# Altium footprint library lib_protel_HC.PCBLIB: 724 footprints (part 30 of 46)
Each footprint in its own frame and in the unit in brackets; x right, y up, seen from the top. Pads: shape width x height; smd on the part's side, far side on the other; paste and mask are expansions set on the pad; w line width, h text height; cw(c..) or ccw(c..) is an arc to the next point about the centre after c.
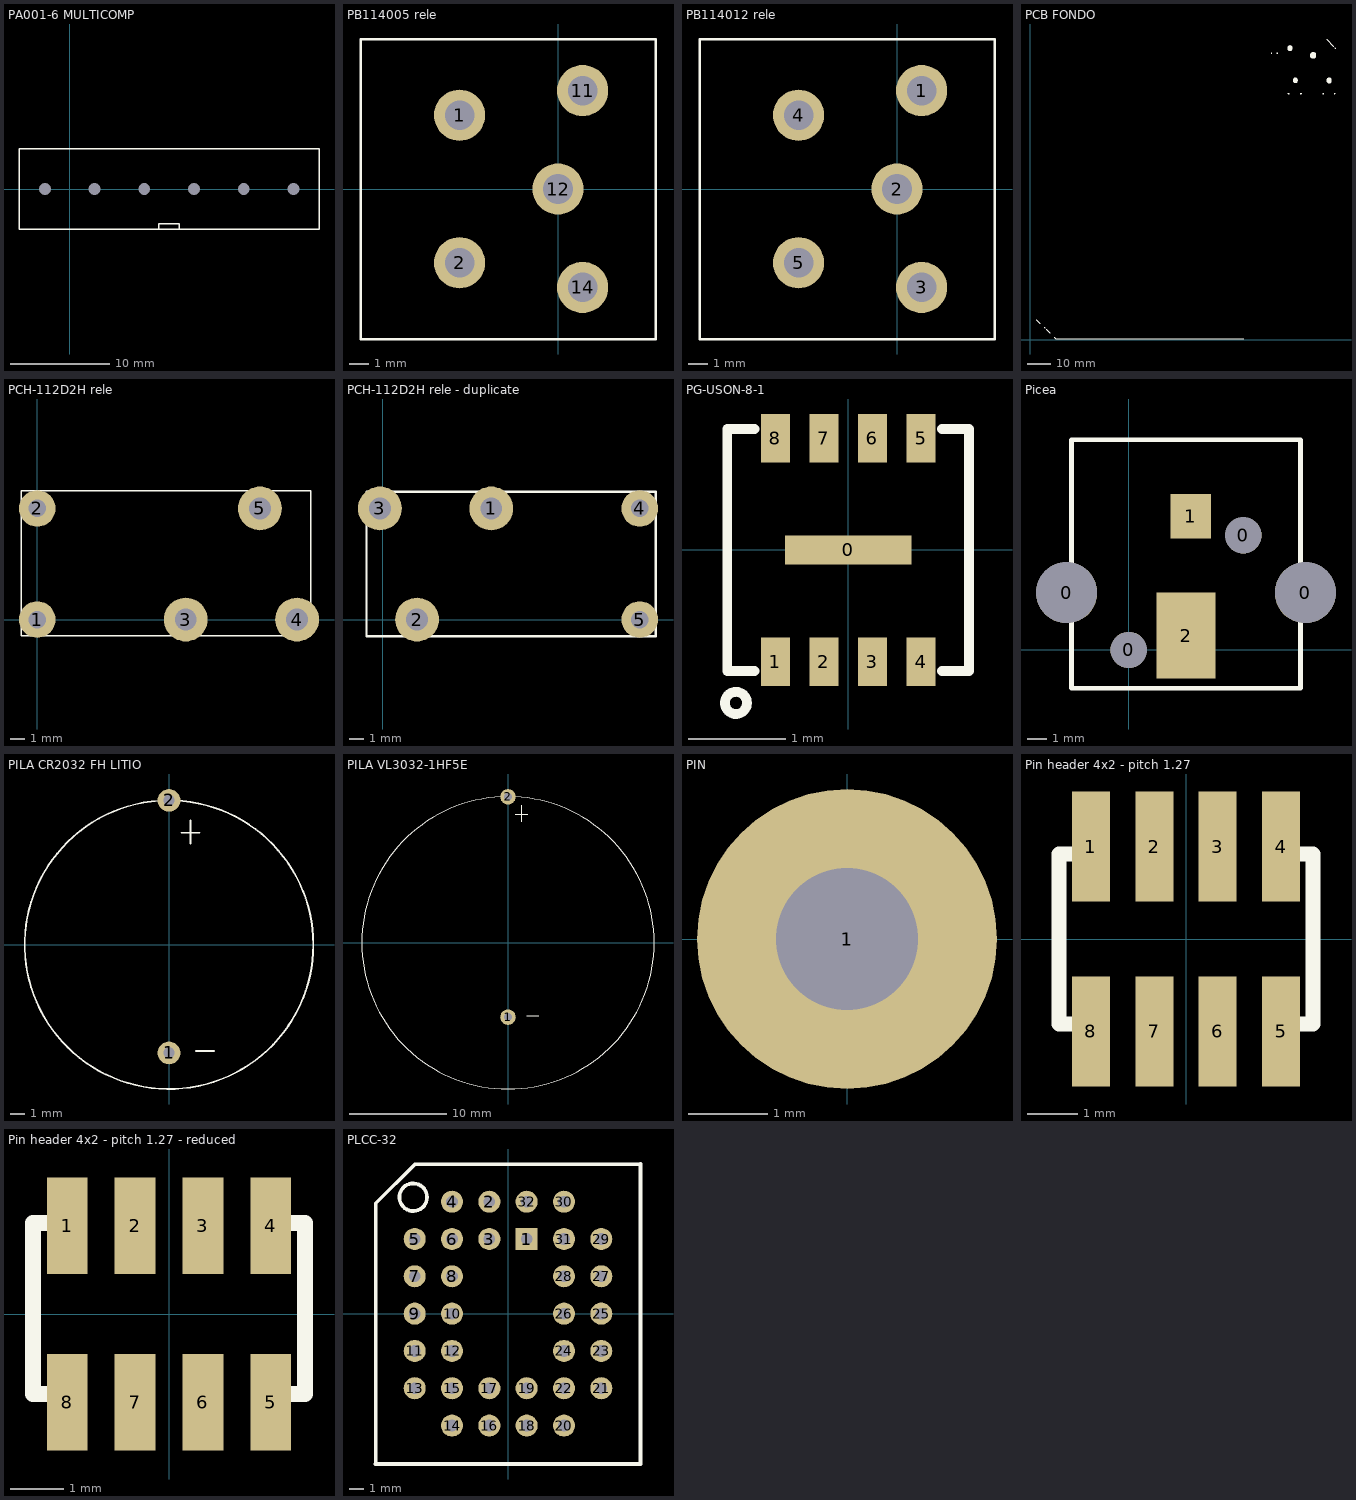
[diagram p29: the footprints below, top view; thin cyan lines are the x and y axes]

## PA001-6 MULTICOMP [mm] "paso 5mm altura 11mm"
height 11
pads (6):
  round 0 / inner round 0 / far side round 2.6 hole 1.2: 1(-2.5,0) 2(2.5,0) 3(7.5,0) 4(12.5,0) 5(17.5,0) 6(22.5,0)
Top Overlay:
  lines w0.127: -5.096,4.048 25.07,4.048 25.07,-4.039 ; -5.08,4.039 -5.08,-4.039 -5.07,-4.048 25.07,-4.048 ; 8.966,-4.013 8.966,-3.505 10.998,-3.505 10.998,-4.013

## PB114005 rele [mm] "RELÉ TYCO 5Vcc"
height 20
pads (5):
  round 2.6 hole 1.5: 1(-5,3.75) 2(-5,-3.75) 11(1.25,5) 12(0,0) 14(1.25,-5)
Top Overlay:
  lines w0.127: -10.033,-7.62 -10.033,0 -10.033,7.62 4.953,7.62 4.953,-7.62 -10.033,-7.62

## PB114012 rele [mm] "RELÉ TYCO 12Vcc"
height 20
pads (5):
  round 2.6 hole 1.5: 1(1.25,5) 2(0,0) 3(1.25,-5) 4(-5,3.75) 5(-5,-3.75)
Top Overlay:
  lines w0.127: -10.033,-7.62 4.953,-7.62 4.953,7.62 -10.033,7.62 -10.033,0 -10.033,-7.62

## PCB FONDO [mm]
Top Overlay:
  drawing of 16 lines, arcs and shapes, not listed

## PCBComponent_1 [mm]

## PCBComponent_1 - duplicate [mm]

## PCH-112D2H rele [mm] "Relé Tyco 12V"
height 15.2
pads (5):
  round 2.5 hole 1.2: 1(0,0) 2(0,7.6)
  round 3 hole 1.5: 3(10.16,0) 4(17.78,0) 5(15.24,7.6)
Top Overlay:
  lines w0.1: -1.1,-1.1 18.7,-1.1 18.7,8.8 -1.1,8.8 -1.1,-1.1

## PCH-112D2H rele - duplicate [mm] "Relé Tyco 12V"
height 15.2
pads (5):
  round 3 hole 1.5: 1(7.44,7.6) 2(2.36,0) 3(-0.18,7.6)
  round 2.5 hole 1.2: 4(17.6,7.6) 5(17.6,0)
Top Overlay:
  lines w0.152: -1.1,-1.15 18.7,-1.15 18.7,8.75 -1.1,8.75 -1.1,-1.15

## PG-USON-8-1 [mm] "MFI chip"
height 0.6
pads (9):
  rect 1.3x0.3 smd mask+0.07: 0(0,0)
  rect 0.3x0.5 smd mask+0.07: 1(-0.75,-1.15) 2(-0.25,-1.15) 3(0.25,-1.15) 4(0.75,-1.15) 5(0.75,1.15) 6(0.25,1.15) 7(-0.25,1.15) 8(-0.75,1.15)
Top Overlay:
  circle w0.1: c-1.155,-1.575 r0.114
  lines w0.1: -0.965,-1.245 -1.245,-1.245 -1.245,1.245 -0.965,1.245 ; 0.965,-1.245 1.245,-1.245 1.245,1.245 0.965,1.245
3D body: height 0.63, standoff 0, extent -1.25,-1.25 1.25,1.25

## Picea [mm] "Antenna Picea"
height 7.1
pads (6):
  round 3.2 hole 3.2: 0(-3.25,3) 0(9.25,3)
  round 1.9 hole 1.9: 0(0,0) 0(6,6)
  rect 2.1x2.35 smd: 1(3.25,7)
  rect 3.1x4.5 smd: 2(3,0.75)
Top Overlay:
  lines w0.254: -3,-2 -3,11 9,11 9,-2 -3,-2

## PILA CR2032 FH LITIO [mm] "PILA NO RECARGABLE CON DOS PINES"
height 3.3
pads (2):
  round 1.6 on Top hole 0.8: 1(0,-7.62) 2(0,10.16)
Top Overlay:
  circle w0.127: c0,0 r10.16
  lines w0.127: 0.889,7.874 2.159,7.874 ; 1.524,7.112 1.524,8.763 ; 1.905,-7.493 3.175,-7.493

## PILA VL3032-1HF5E [mm]
height 2
pads (2):
  round 1.6 on Top hole 0.8: 1(0,-7.62) 2(0,14.986)
Top Overlay:
  circle w0.127: c0,0 r15
  lines w0.127: 0.762,13.208 2.032,13.208 ; 1.397,12.446 1.397,14.097 ; 1.905,-7.493 3.175,-7.493

## PIN [mm] "PIN SUELTO."
pads (1):
  round 3.8 hole 1.8: 1(0,0)

## Pin header 4x2 - pitch 1.27 [mm] "Pin header 4x2 - pitch 1.27"
height 5
pads (8):
  rect 0.76x2.2 smd: 1(-1.905,1.85) 2(-0.635,1.85) 3(0.635,1.85) 4(1.905,1.85) 5(1.905,-1.85) 6(0.635,-1.85) 7(-0.635,-1.85) 8(-1.905,-1.85)
Top Overlay:
  lines w0.3: -2.3,-1.7 -2.54,-1.7 -2.54,1.7 -2.3,1.7 ; 2.3,-1.7 2.54,-1.7 2.54,1.7 2.3,1.7

## Pin header 4x2 - pitch 1.27 - reduced [mm] "Pin header 4x2 - pitch 1.27"
height 5
pads (8):
  rect 0.76x1.8 smd: 1(-1.905,1.65) 2(-0.635,1.65) 3(0.635,1.65) 4(1.905,1.65) 5(1.905,-1.65) 6(0.635,-1.65) 7(-0.635,-1.65) 8(-1.905,-1.65)
Top Overlay:
  lines w0.3: -2.3,-1.5 -2.54,-1.5 -2.54,1.7 -2.3,1.7 ; 2.3,-1.5 2.54,-1.5 2.54,1.7 2.3,1.7

## PLCC-32 [mm]
pads (32):
  rect 1.5x1.5 on Top hole 0.8: 1(1.27,5.08)
  round 1.5 on Top hole 0.8: 2(-1.27,7.62) 3(-1.27,5.08) 4(-3.81,7.62) 5(-6.35,5.08) 6(-3.81,5.08) 7(-6.35,2.54) 8(-3.81,2.54) 9(-6.35,0) 10(-3.81,0) 11(-6.35,-2.54) 12(-3.81,-2.54) 13(-6.35,-5.08) 14(-3.81,-7.62) 15(-3.81,-5.08) 16(-1.27,-7.62) 17(-1.27,-5.08) 18(1.27,-7.62) 19(1.27,-5.08) 20(3.81,-7.62) 21(6.35,-5.08) 22(3.81,-5.08) 23(6.35,-2.54) 24(3.81,-2.54) 25(6.35,0) 26(3.81,0) 27(6.35,2.54) 28(3.81,2.54) 29(6.35,5.08) 30(3.81,7.62) 31(3.81,5.08) 32(1.27,7.62)
Top Overlay:
  circle w0.254: c-6.452,7.925 r0.94
  lines w0.254: -9.017,-10.236 9.017,-10.236 9.017,10.185 -6.35,10.16 -9,7.51 -9,-10.22